# Altium integrated library TI Power Management DC-DC Controller (External Switch).IntLib: 349 symbols (part 15 of 22)
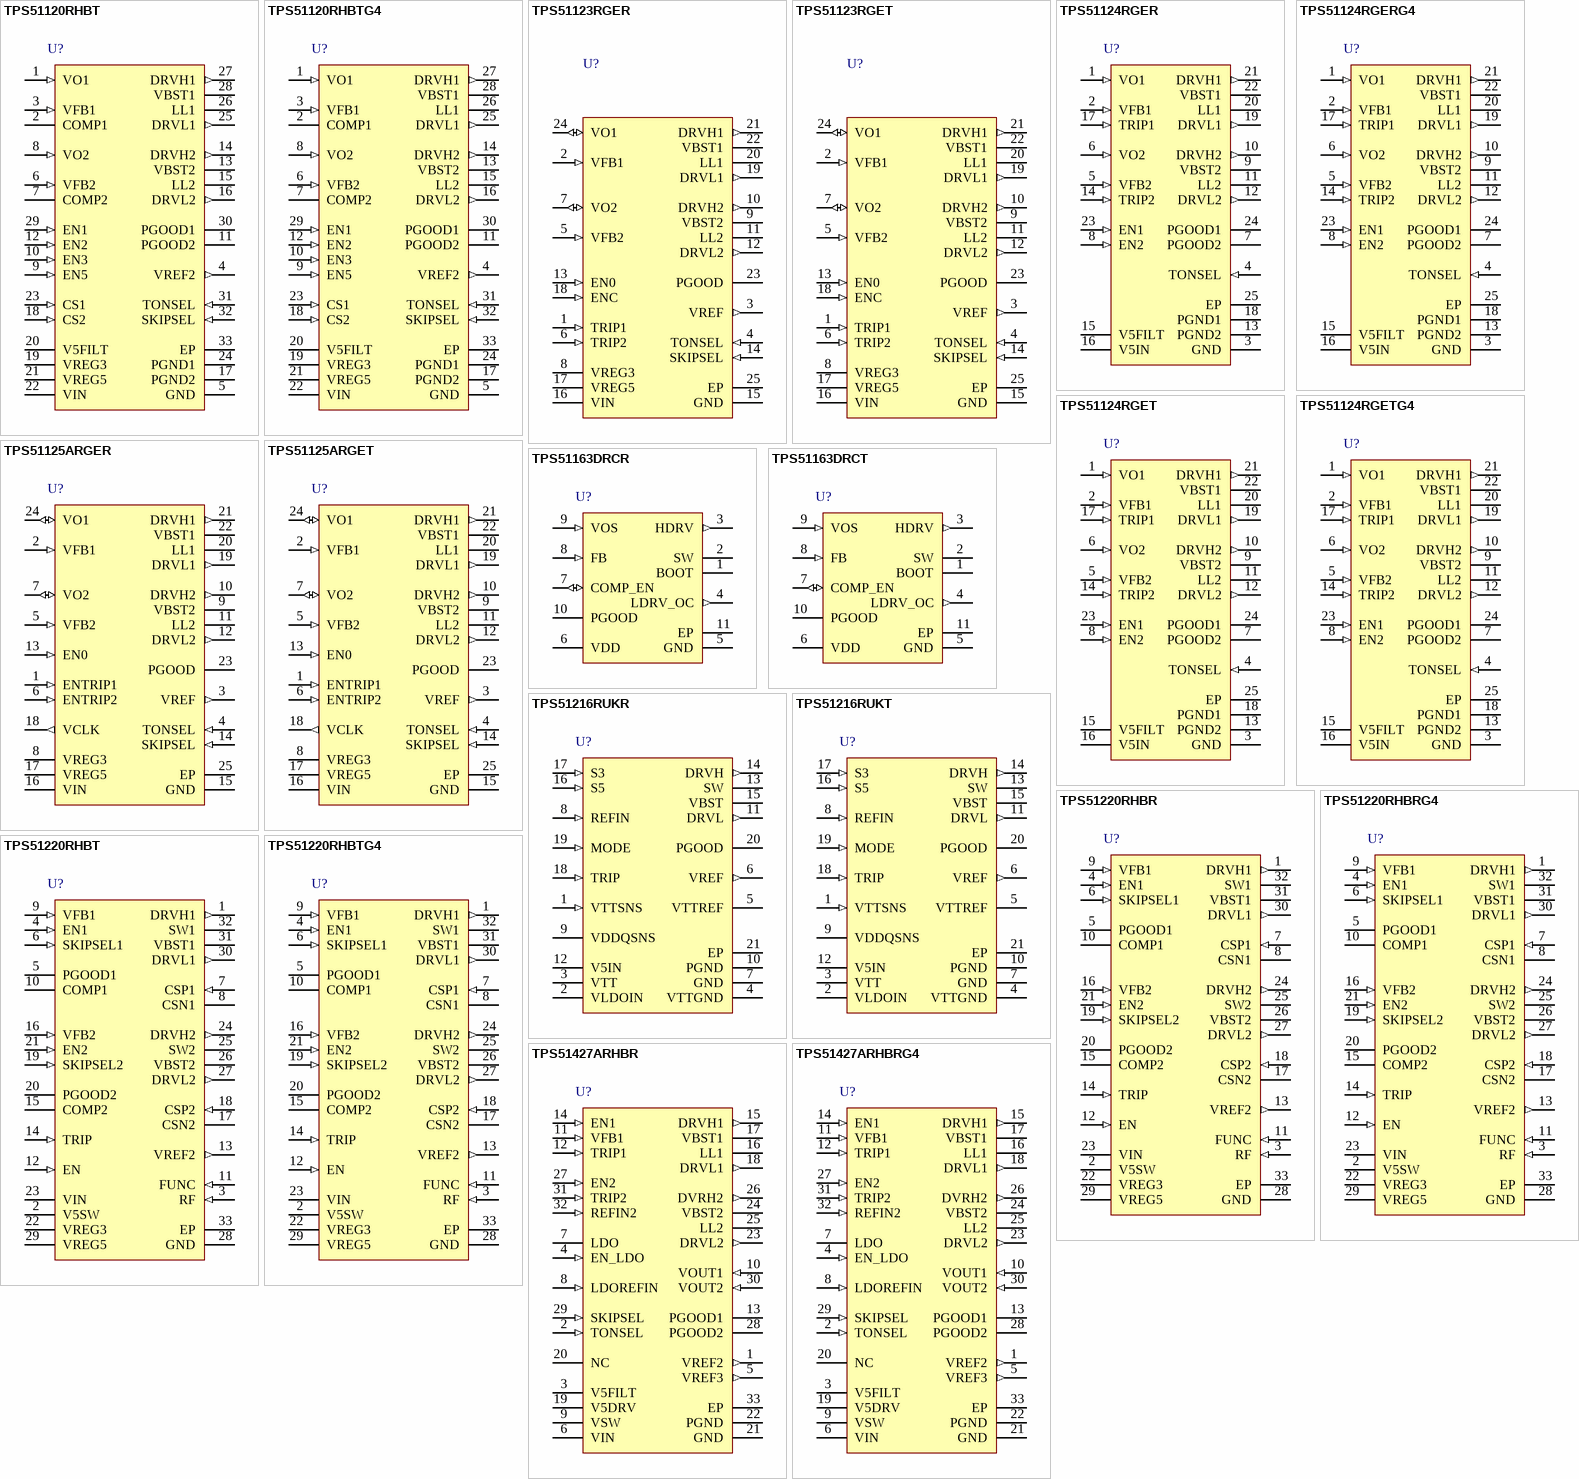
[diagram p28: symbols TPS51120RHBT to TPS51427ARHBRG4]

## TPS51123RGER
designator U?
Dual-Synchronous, Step-Down Controller with Out-of-Audio Operation, 100 mA LDOs for Notebook Sys. Pwr, 93 % Duty Cycle, 5.5 to 28 V, -40 to 85 degC, 24-pin VQFN (RGE), Green (RoHS & no Sb/Br); Manufacturer: Texas Instruments; PartNumber: TPS51123RGER; Duty Cycle(Max)(%): 93; Iout(Max)(A): 20; Regulated Outputs(#): 2; SubFamily: Multiple-Output Switching Controller; Switching Frequency(Max)(kHz): 460; Synchronous Rectification: TRUE; Topology: Buck, D-CAP Mode"; Vin(Max)(V): 28; Vin(Min)(V): 5.5; DatasheetVersion: SLUS890D; PackageVersion: revG, Jul-2011; PackageReference: RGE24-2450X2450TP; PackageDescription: 24-Pin Plastic Quad Flatpack No-Lead, 4 x 4 mm Body, 0.5 mm Pitch; Supplier 1: Digi-Key; Supplier Part Number 1: TPS51123RGER-ND; Eco-Plan: Green (RoHS & no Sb/Br); Iout2(A): 20; Vout(Max)(V): 5.5; Vout(Min)(V): 2; Vout2(Max)(V): 5.5; Vout2(Min)(V): 2; Mounting Technology: Surface Mount; Code_JEDEC: MO-220; ComponentLink1Description: Datasheet; ComponentLink1URL: http://www.ti.com/general/docs/lit/getliterature.tsp?genericPartNumber=TPS51123&fileType=pdf; ComponentLink2Description: Package Specification; ComponentLink2URL: http://www.ti.com/litv/pdf/mpqf124f
footprint RGE24-2450X2450TP (QFN, 24-Leads, Body 4x4mm, Pitch 0.5mm, Thermal Pad 2.45x2.45mm, TI Recommended)
pins: 1 TRIP1 (in) "OCL trip setting pins. Connect resistor from this pin to GND to set threshold for synchronous RDS(on) sense.", 2 VFB1 (in) "SMPS feedback inputs. Connect with feedback resistor divider", 3 VREF (out) "2-V reference voltage output. Connect 220-nF to 1-uF ceramic capacitor to Signal GND near the device.", 4 TONSEL (in) "On-time adjustment pin.365 kHz/460 kHz setting: connect to VREG5   300 kHz/375 kHz setting: connect to VREG3    245 kHz/305 kHz setting: connect to VREF   200 kHz/250 kHz setting: connect to GND", 5 VFB2 (in) "SMPS feedback inputs. Connect with feedback resistor divider", 6 TRIP2 (in) "OCL trip setting pins. Connect resistor from this pin to GND to set threshold for synchronous RDS(on) sense.", 7 VO2 (io) "Output connection to SMPS. These terminals work as fixed voltage inputs and output discharge inputs. VO1 and VO2 also work as 5-V and 3.3-V switch over return power input respectively.", 8 VREG3 (power) "3.3-V power supply output. Connect a 10-uF ceramic capacitor to Power GND near the device. A 1-uF ceramic capacitor is acceptable when not loaded.", 9 VBST2 (power) "Supply input for high-side N-channel MOSFET driver (boost terminal).", 10 DRVH2 (out) "High-side N-channel MOSFET driver outputs. LL referenced drivers.", 11 LL2 (power) "Switch node connections for high-side drivers, current limit and control circuitry.", 12 DRVL2 (out) "Low-side N-channel MOSFET driver outputs. GND referenced drivers.", 13 EN0 (in) "Master enable input. Open : LDOs on, and ready to turn both switcher channels.GND : disable all circuit", 14 SKIPSEL (in) "Selection pin for operation mode:OOA auto skip : Connect to VREG3 or VREG5   PWM only: Connect to VREF  Auto skip: Connect to GND", 15 GND (power) "Ground.", 16 VIN (power) "High voltage power supply input for 5-V/3.3-V LDO.", 17 VREG5 (power) "5-V power supply output. Connect a 33-uF ceramic capacitor to Power GND near the device.", 18 ENC (in) "Channel 1 and Channel 2 enable input. Pull up to the voltage ranging 3.3-V to 5-V to turn on both switcher channels. Short to ground to shutdown them.", 19 DRVL1 (out) "Low-side N-channel MOSFET driver outputs. GND referenced drivers.", 20 LL1 (power) "Switch node connections for high-side drivers, current limit and control circuitry.", 21 DRVH1 (out) "High-side N-channel MOSFET driver outputs. LL referenced drivers.", 22 VBST1 (power) "Supply input for high-side N-channel MOSFET driver (boost terminal).", 23 PGOOD (oc) "Powergood window comparator output for channel 1 and 2. (Logical AND)", 24 VO1 (io) "Output connection to SMPS. These terminals work as fixed voltage inputs and output discharge inputs. VO1 and VO2 also work as 5-V and 3.3-V switch over return power input respectively.", 25 EP (power) "Exposed Thermal Pad"

## TPS51123RGET
designator U?
Dual-Synchronous, Step-Down Controller with Out-of-Audio Operation, 100 mA LDOs for Notebook Sys. Pwr, 93 % Duty Cycle, 5.5 to 28 V, -40 to 85 degC, 24-pin VQFN (RGE), Green (RoHS & no Sb/Br); Manufacturer: Texas Instruments; PartNumber: TPS51123RGET; Duty Cycle(Max)(%): 93; Iout(Max)(A): 20; Regulated Outputs(#): 2; SubFamily: Multiple-Output Switching Controller; Switching Frequency(Max)(kHz): 460; Synchronous Rectification: TRUE; Topology: Buck, D-CAP Mode"; Vin(Max)(V): 28; Vin(Min)(V): 5.5; DatasheetVersion: SLUS890D; PackageVersion: revG, Jul-2011; PackageReference: RGE24-2450X2450TP; PackageDescription: 24-Pin Plastic Quad Flatpack No-Lead, 4 x 4 mm Body, 0.5 mm Pitch; Supplier 1: Digi-Key; Supplier Part Number 1: 296-24069-2-ND; Eco-Plan: Green (RoHS & no Sb/Br); Iout2(A): 20; Vout(Max)(V): 5.5; Vout(Min)(V): 2; Vout2(Max)(V): 5.5; Vout2(Min)(V): 2; Mounting Technology: Surface Mount; Code_JEDEC: MO-220; ComponentLink1Description: Datasheet; ComponentLink1URL: http://www.ti.com/general/docs/lit/getliterature.tsp?genericPartNumber=TPS51123&fileType=pdf; ComponentLink2Description: Package Specification; ComponentLink2URL: http://www.ti.com/litv/pdf/mpqf124f
footprint RGE24-2450X2450TP (QFN, 24-Leads, Body 4x4mm, Pitch 0.5mm, Thermal Pad 2.45x2.45mm, TI Recommended)
pins: 1 TRIP1 (in) "OCL trip setting pins. Connect resistor from this pin to GND to set threshold for synchronous RDS(on) sense.", 2 VFB1 (in) "SMPS feedback inputs. Connect with feedback resistor divider", 3 VREF (out) "2-V reference voltage output. Connect 220-nF to 1-uF ceramic capacitor to Signal GND near the device.", 4 TONSEL (in) "On-time adjustment pin.365 kHz/460 kHz setting: connect to VREG5   300 kHz/375 kHz setting: connect to VREG3    245 kHz/305 kHz setting: connect to VREF   200 kHz/250 kHz setting: connect to GND", 5 VFB2 (in) "SMPS feedback inputs. Connect with feedback resistor divider", 6 TRIP2 (in) "OCL trip setting pins. Connect resistor from this pin to GND to set threshold for synchronous RDS(on) sense.", 7 VO2 (io) "Output connection to SMPS. These terminals work as fixed voltage inputs and output discharge inputs. VO1 and VO2 also work as 5-V and 3.3-V switch over return power input respectively.", 8 VREG3 (power) "3.3-V power supply output. Connect a 10-uF ceramic capacitor to Power GND near the device. A 1-uF ceramic capacitor is acceptable when not loaded.", 9 VBST2 (power) "Supply input for high-side N-channel MOSFET driver (boost terminal).", 10 DRVH2 (out) "High-side N-channel MOSFET driver outputs. LL referenced drivers.", 11 LL2 (power) "Switch node connections for high-side drivers, current limit and control circuitry.", 12 DRVL2 (out) "Low-side N-channel MOSFET driver outputs. GND referenced drivers.", 13 EN0 (in) "Master enable input. Open : LDOs on, and ready to turn both switcher channels.GND : disable all circuit", 14 SKIPSEL (in) "Selection pin for operation mode:OOA auto skip : Connect to VREG3 or VREG5   PWM only: Connect to VREF  Auto skip: Connect to GND", 15 GND (power) "Ground.", 16 VIN (power) "High voltage power supply input for 5-V/3.3-V LDO.", 17 VREG5 (power) "5-V power supply output. Connect a 33-uF ceramic capacitor to Power GND near the device.", 18 ENC (in) "Channel 1 and Channel 2 enable input. Pull up to the voltage ranging 3.3-V to 5-V to turn on both switcher channels. Short to ground to shutdown them.", 19 DRVL1 (out) "Low-side N-channel MOSFET driver outputs. GND referenced drivers.", 20 LL1 (power) "Switch node connections for high-side drivers, current limit and control circuitry.", 21 DRVH1 (out) "High-side N-channel MOSFET driver outputs. LL referenced drivers.", 22 VBST1 (power) "Supply input for high-side N-channel MOSFET driver (boost terminal).", 23 PGOOD (oc) "Powergood window comparator output for channel 1 and 2. (Logical AND)", 24 VO1 (io) "Output connection to SMPS. These terminals work as fixed voltage inputs and output discharge inputs. VO1 and VO2 also work as 5-V and 3.3-V switch over return power input respectively.", 25 EP (power) "Exposed Thermal Pad"

## TPS51124RGER
designator U?
Dual, Synchronous Step Down Controller for Low Voltage System Power, 88 % Duty Cycle, 3 to 28 V, -40 to 85 degC, 24-pin VQFN (RGE), Green (RoHS & no Sb/Br); Manufacturer: Texas Instruments; PartNumber: TPS51124RGER; Duty Cycle(Max)(%): 88; Iout(Max)(A): 15; Iout2(A): 20; Regulated Outputs(#): 2; SubFamily: Multiple-Output Switching Controller; Switching Frequency(Max)(kHz): 420; Synchronous Rectification: TRUE; Topology: Buck, D-CAP Mode"; Vin(Max)(V): 28; Vin(Min)(V): 3; Vout(Max)(V): 5.5; Vout(Min)(V): 0.76; DatasheetVersion: SLVS616B; PackageVersion: revG, Jul-2011; PackageReference: RGE24-2450X2450TP; PackageDescription: 24-Pin Plastic Quad Flatpack No-Lead, 4 x 4 mm Body, 0.5 mm Pitch; Supplier 1: Digi-Key; Supplier Part Number 1: 296-26976-2-ND; Eco-Plan: Green (RoHS & no Sb/Br); Vout2(Max)(V): 5.5; Vout2(Min)(V): 0.76; Mounting Technology: Surface Mount; Code_JEDEC: MO-220; ComponentLink1Description: Datasheet; ComponentLink1URL: http://www.ti.com/general/docs/lit/getliterature.tsp?genericPartNumber=TPS51124&fileType=pdf; ComponentLink2Description: Package Specification; ComponentLink2URL: http://www.ti.com/litv/pdf/mpqf124f
footprint RGE24-2450X2450TP (QFN, 24-Leads, Body 4x4mm, Pitch 0.5mm, Thermal Pad 2.45x2.45mm, TI Recommended)
pins: 1 VO1 (in) "Output connections to SMPS. This terminal serve two functions: On-time adjustment and output discharge.", 2 VFB1 (in) "SMPS voltage feedback input. Connect with feedback resistor divider.", 3 GND (power) "Signal ground pin", 4 TONSEL (in) "On-time selection pin.", 5 VFB2 (in) "SMPS voltage feedback input. Connect with feedback resistor divider.", 6 VO2 (in) "Output connections to SMPS. This terminal serve two functions: On-time adjustment and output  discharge.", 7 PGOOD2 (oc) "Power Good window comparator open drain output for channel 2. Pull up with a resistor to 5 V, or appropriate signal voltage. Current capability is 5 mA. PGOOD goes high 0.5 ms after VFB comes within specified limits. Power (See Datasheet)", 8 EN2 (in) "Channel 2 enable pin. Connect to 5 V or 3.3 V to turn on SMPS", 9 VBST2 (power) "Supply input for synchronous high-side MOSFET driver (Boost Terminal). Connect capacitor from this pin to respective LL terminals. An internal PN diode is connected between V5IN to each of these pins. User can add external (See Datasheet)", 10 DRVH2 (out) "Synchronous high-side MOSFET driver output. LL node referenced floating drivers. The gate drive voltage is defined by the voltage across VBST to LL node flying capacitor.", 11 LL2 (power) "Switch node connections for high-side drivers return. Also serve as input to current comparators and input voltage monitor for on-time control circuitry.", 12 DRVL2 (out) "Synchronous low-side MOSFET driver output. PGND referenced drivers. The gate drive voltage is defined by V5IN voltage.", 13 PGND2 (power) "Ground returns for DRVL1 and DRVL2. Also serve as input of current comparators. Connect PGND1, PGND2, and GND strongly together near the IC. Output discharge current flows through this pin, also.", 14 TRIP2 (in) "Over-current trip point set input. Connect resistor from this pin to GND to set threshold for synchronous low-side RDS(on) sense. Voltage across this pin and GND is compared to voltage across PGND and LL at over-current (See Datasheet)", 15 V5FILT (power) "5-V power supply input for the entire control circuit except the MOSFET drivers. Connect RC low-pass filter from V5IN to V5FILT.", 16 V5IN (power) "5-V power supply input for FET gate drivers. Internally connected to VBSTx by PN diodes.", 17 TRIP1 (in) "Over-current trip point set input. Connect resistor from this pin to GND to set threshold for synchronous low-side RDS(on) sense. Voltage across this pin and GND is compared to voltage across PGND and LL at over-current (See Datasheet)", 18 PGND1 (power) "Ground returns for DRVL1 and DRVL2. Also serve as input of current comparators. Connect PGND1, PGND2, and GND strongly together near the IC. Output discharge current flows through this pin, also.", 19 DRVL1 (out) "Synchronous low-side MOSFET driver output. PGND referenced drivers. The gate drive voltage is defined by V5IN voltage.", 20 LL1 (power) "Switch node connections for high-side drivers return. Also serve as input to current comparators and input voltage monitor for on-time control circuitry.", 21 DRVH1 (out) "Synchronous high-side MOSFET driver output. LL node referenced floating drivers. The gate drive voltage is defined by the voltage across VBST to LL node flying capacitor.", 22 VBST1 (power) "Supply input for synchronous high-side MOSFET driver (Boost Terminal). Connect capacitor from this pin to respective LL terminals. An internal PN diode is connected between V5IN to each of these pins. User can add external (See Datasheet)", 23 EN1 (in) "Channel 1 enable pin. Connect to 5 V or 3.3 V to turn on SMPS", 24 PGOOD1 (oc) "Power Good window comparator open drain output for channel 1. Pull up with a resistor to 5 V, or appropriate signal voltage. Current capability is 5 mA. PGOOD goes high 0.5 ms after VFB comes within specified limits. Power (See Datasheet)", 25 EP "Exposed Thermal Pad."

## TPS51124RGERG4
designator U?
Dual, Synchronous Step Down Controller for Low Voltage System Power, 88 % Duty Cycle, 3 to 28 V, -40 to 85 degC, 24-pin VQFN (RGE), Green (RoHS & no Sb/Br); Manufacturer: Texas Instruments; PartNumber: TPS51124RGERG4; Duty Cycle(Max)(%): 88; Iout(Max)(A): 15; Iout2(A): 20; Regulated Outputs(#): 2; SubFamily: Multiple-Output Switching Controller; Switching Frequency(Max)(kHz): 420; Synchronous Rectification: TRUE; Topology: Buck, D-CAP Mode"; Vin(Max)(V): 28; Vin(Min)(V): 3; Vout(Max)(V): 5.5; Vout(Min)(V): 0.76; DatasheetVersion: SLVS616B; PackageVersion: revG, Jul-2011; PackageReference: RGE24-2450X2450TP; PackageDescription: 24-Pin Plastic Quad Flatpack No-Lead, 4 x 4 mm Body, 0.5 mm Pitch; Supplier 1: Digi-Key; Supplier Part Number 1: TPS51124RGERG4-ND; Eco-Plan: Green (RoHS & no Sb/Br); Vout2(Max)(V): 5.5; Vout2(Min)(V): 0.76; Mounting Technology: Surface Mount; Code_JEDEC: MO-220; ComponentLink1Description: Datasheet; ComponentLink1URL: http://www.ti.com/general/docs/lit/getliterature.tsp?genericPartNumber=TPS51124&fileType=pdf; ComponentLink2Description: Package Specification; ComponentLink2URL: http://www.ti.com/litv/pdf/mpqf124f
footprint RGE24-2450X2450TP (QFN, 24-Leads, Body 4x4mm, Pitch 0.5mm, Thermal Pad 2.45x2.45mm, TI Recommended)
pins: 1 VO1 (in) "Output connections to SMPS. This terminal serve two functions: On-time adjustment and output discharge.", 2 VFB1 (in) "SMPS voltage feedback input. Connect with feedback resistor divider.", 3 GND (power) "Signal ground pin", 4 TONSEL (in) "On-time selection pin.", 5 VFB2 (in) "SMPS voltage feedback input. Connect with feedback resistor divider.", 6 VO2 (in) "Output connections to SMPS. This terminal serve two functions: On-time adjustment and output  discharge.", 7 PGOOD2 (oc) "Power Good window comparator open drain output for channel 2. Pull up with a resistor to 5 V, or appropriate signal voltage. Current capability is 5 mA. PGOOD goes high 0.5 ms after VFB comes within specified limits. Power (See Datasheet)", 8 EN2 (in) "Channel 2 enable pin. Connect to 5 V or 3.3 V to turn on SMPS", 9 VBST2 (power) "Supply input for synchronous high-side MOSFET driver (Boost Terminal). Connect capacitor from this pin to respective LL terminals. An internal PN diode is connected between V5IN to each of these pins. User can add external (See Datasheet)", 10 DRVH2 (out) "Synchronous high-side MOSFET driver output. LL node referenced floating drivers. The gate drive voltage is defined by the voltage across VBST to LL node flying capacitor.", 11 LL2 (power) "Switch node connections for high-side drivers return. Also serve as input to current comparators and input voltage monitor for on-time control circuitry.", 12 DRVL2 (out) "Synchronous low-side MOSFET driver output. PGND referenced drivers. The gate drive voltage is defined by V5IN voltage.", 13 PGND2 (power) "Ground returns for DRVL1 and DRVL2. Also serve as input of current comparators. Connect PGND1, PGND2, and GND strongly together near the IC. Output discharge current flows through this pin, also.", 14 TRIP2 (in) "Over-current trip point set input. Connect resistor from this pin to GND to set threshold for synchronous low-side RDS(on) sense. Voltage across this pin and GND is compared to voltage across PGND and LL at over-current (See Datasheet)", 15 V5FILT (power) "5-V power supply input for the entire control circuit except the MOSFET drivers. Connect RC low-pass filter from V5IN to V5FILT.", 16 V5IN (power) "5-V power supply input for FET gate drivers. Internally connected to VBSTx by PN diodes.", 17 TRIP1 (in) "Over-current trip point set input. Connect resistor from this pin to GND to set threshold for synchronous low-side RDS(on) sense. Voltage across this pin and GND is compared to voltage across PGND and LL at over-current (See Datasheet)", 18 PGND1 (power) "Ground returns for DRVL1 and DRVL2. Also serve as input of current comparators. Connect PGND1, PGND2, and GND strongly together near the IC. Output discharge current flows through this pin, also.", 19 DRVL1 (out) "Synchronous low-side MOSFET driver output. PGND referenced drivers. The gate drive voltage is defined by V5IN voltage.", 20 LL1 (power) "Switch node connections for high-side drivers return. Also serve as input to current comparators and input voltage monitor for on-time control circuitry.", 21 DRVH1 (out) "Synchronous high-side MOSFET driver output. LL node referenced floating drivers. The gate drive voltage is defined by the voltage across VBST to LL node flying capacitor.", 22 VBST1 (power) "Supply input for synchronous high-side MOSFET driver (Boost Terminal). Connect capacitor from this pin to respective LL terminals. An internal PN diode is connected between V5IN to each of these pins. User can add external (See Datasheet)", 23 EN1 (in) "Channel 1 enable pin. Connect to 5 V or 3.3 V to turn on SMPS", 24 PGOOD1 (oc) "Power Good window comparator open drain output for channel 1. Pull up with a resistor to 5 V, or appropriate signal voltage. Current capability is 5 mA. PGOOD goes high 0.5 ms after VFB comes within specified limits. Power (See Datasheet)", 25 EP "Exposed Thermal Pad."

## TPS51124RGET
designator U?
Dual, Synchronous Step Down Controller for Low Voltage System Power, 88 % Duty Cycle, 3 to 28 V, -40 to 85 degC, 24-pin VQFN (RGE), Green (RoHS & no Sb/Br); Manufacturer: Texas Instruments; PartNumber: TPS51124RGET; Duty Cycle(Max)(%): 88; Iout(Max)(A): 15; Iout2(A): 20; Regulated Outputs(#): 2; SubFamily: Multiple-Output Switching Controller; Switching Frequency(Max)(kHz): 420; Synchronous Rectification: TRUE; Topology: Buck, D-CAP Mode"; Vin(Max)(V): 28; Vin(Min)(V): 3; Vout(Max)(V): 5.5; Vout(Min)(V): 0.76; DatasheetVersion: SLVS616B; PackageVersion: revG, Jul-2011; PackageReference: RGE24-2450X2450TP; PackageDescription: 24-Pin Plastic Quad Flatpack No-Lead, 4 x 4 mm Body, 0.5 mm Pitch; Supplier 1: Digi-Key; Supplier Part Number 1: 296-19295-2-ND; Eco-Plan: Green (RoHS & no Sb/Br); Vout2(Max)(V): 5.5; Vout2(Min)(V): 0.76; Mounting Technology: Surface Mount; Code_JEDEC: MO-220; ComponentLink1Description: Datasheet; ComponentLink1URL: http://www.ti.com/general/docs/lit/getliterature.tsp?genericPartNumber=TPS51124&fileType=pdf; ComponentLink2Description: Package Specification; ComponentLink2URL: http://www.ti.com/litv/pdf/mpqf124f
footprint RGE24-2450X2450TP (QFN, 24-Leads, Body 4x4mm, Pitch 0.5mm, Thermal Pad 2.45x2.45mm, TI Recommended)
pins: 1 VO1 (in) "Output connections to SMPS. This terminal serve two functions: On-time adjustment and output discharge.", 2 VFB1 (in) "SMPS voltage feedback input. Connect with feedback resistor divider.", 3 GND (power) "Signal ground pin", 4 TONSEL (in) "On-time selection pin.", 5 VFB2 (in) "SMPS voltage feedback input. Connect with feedback resistor divider.", 6 VO2 (in) "Output connections to SMPS. This terminal serve two functions: On-time adjustment and output  discharge.", 7 PGOOD2 (oc) "Power Good window comparator open drain output for channel 2. Pull up with a resistor to 5 V, or appropriate signal voltage. Current capability is 5 mA. PGOOD goes high 0.5 ms after VFB comes within specified limits. Power (See Datasheet)", 8 EN2 (in) "Channel 2 enable pin. Connect to 5 V or 3.3 V to turn on SMPS", 9 VBST2 (power) "Supply input for synchronous high-side MOSFET driver (Boost Terminal). Connect capacitor from this pin to respective LL terminals. An internal PN diode is connected between V5IN to each of these pins. User can add external (See Datasheet)", 10 DRVH2 (out) "Synchronous high-side MOSFET driver output. LL node referenced floating drivers. The gate drive voltage is defined by the voltage across VBST to LL node flying capacitor.", 11 LL2 (power) "Switch node connections for high-side drivers return. Also serve as input to current comparators and input voltage monitor for on-time control circuitry.", 12 DRVL2 (out) "Synchronous low-side MOSFET driver output. PGND referenced drivers. The gate drive voltage is defined by V5IN voltage.", 13 PGND2 (power) "Ground returns for DRVL1 and DRVL2. Also serve as input of current comparators. Connect PGND1, PGND2, and GND strongly together near the IC. Output discharge current flows through this pin, also.", 14 TRIP2 (in) "Over-current trip point set input. Connect resistor from this pin to GND to set threshold for synchronous low-side RDS(on) sense. Voltage across this pin and GND is compared to voltage across PGND and LL at over-current (See Datasheet)", 15 V5FILT (power) "5-V power supply input for the entire control circuit except the MOSFET drivers. Connect RC low-pass filter from V5IN to V5FILT.", 16 V5IN (power) "5-V power supply input for FET gate drivers. Internally connected to VBSTx by PN diodes.", 17 TRIP1 (in) "Over-current trip point set input. Connect resistor from this pin to GND to set threshold for synchronous low-side RDS(on) sense. Voltage across this pin and GND is compared to voltage across PGND and LL at over-current (See Datasheet)", 18 PGND1 (power) "Ground returns for DRVL1 and DRVL2. Also serve as input of current comparators. Connect PGND1, PGND2, and GND strongly together near the IC. Output discharge current flows through this pin, also.", 19 DRVL1 (out) "Synchronous low-side MOSFET driver output. PGND referenced drivers. The gate drive voltage is defined by V5IN voltage.", 20 LL1 (power) "Switch node connections for high-side drivers return. Also serve as input to current comparators and input voltage monitor for on-time control circuitry.", 21 DRVH1 (out) "Synchronous high-side MOSFET driver output. LL node referenced floating drivers. The gate drive voltage is defined by the voltage across VBST to LL node flying capacitor.", 22 VBST1 (power) "Supply input for synchronous high-side MOSFET driver (Boost Terminal). Connect capacitor from this pin to respective LL terminals. An internal PN diode is connected between V5IN to each of these pins. User can add external (See Datasheet)", 23 EN1 (in) "Channel 1 enable pin. Connect to 5 V or 3.3 V to turn on SMPS", 24 PGOOD1 (oc) "Power Good window comparator open drain output for channel 1. Pull up with a resistor to 5 V, or appropriate signal voltage. Current capability is 5 mA. PGOOD goes high 0.5 ms after VFB comes within specified limits. Power (See Datasheet)", 25 EP "Exposed Thermal Pad."

## TPS51124RGETG4
designator U?
Dual, Synchronous Step Down Controller for Low Voltage System Power, 88 % Duty Cycle, 3 to 28 V, -40 to 85 degC, 24-pin VQFN (RGE), Green (RoHS & no Sb/Br); Manufacturer: Texas Instruments; PartNumber: TPS51124RGETG4; Duty Cycle(Max)(%): 88; Iout(Max)(A): 15; Iout2(A): 20; Regulated Outputs(#): 2; SubFamily: Multiple-Output Switching Controller; Switching Frequency(Max)(kHz): 420; Synchronous Rectification: TRUE; Topology: Buck, D-CAP Mode"; Vin(Max)(V): 28; Vin(Min)(V): 3; Vout(Max)(V): 5.5; Vout(Min)(V): 0.76; DatasheetVersion: SLVS616B; PackageVersion: revG, Jul-2011; PackageReference: RGE24-2450X2450TP; PackageDescription: 24-Pin Plastic Quad Flatpack No-Lead, 4 x 4 mm Body, 0.5 mm Pitch; Supplier 1: Digi-Key; Supplier Part Number 1: TPS51124RGETG4-ND; Eco-Plan: Green (RoHS & no Sb/Br); Vout2(Max)(V): 5.5; Vout2(Min)(V): 0.76; Mounting Technology: Surface Mount; Code_JEDEC: MO-220; ComponentLink1Description: Datasheet; ComponentLink1URL: http://www.ti.com/general/docs/lit/getliterature.tsp?genericPartNumber=TPS51124&fileType=pdf; ComponentLink2Description: Package Specification; ComponentLink2URL: http://www.ti.com/litv/pdf/mpqf124f
footprint RGE24-2450X2450TP (QFN, 24-Leads, Body 4x4mm, Pitch 0.5mm, Thermal Pad 2.45x2.45mm, TI Recommended)
pins: 1 VO1 (in) "Output connections to SMPS. This terminal serve two functions: On-time adjustment and output discharge.", 2 VFB1 (in) "SMPS voltage feedback input. Connect with feedback resistor divider.", 3 GND (power) "Signal ground pin", 4 TONSEL (in) "On-time selection pin.", 5 VFB2 (in) "SMPS voltage feedback input. Connect with feedback resistor divider.", 6 VO2 (in) "Output connections to SMPS. This terminal serve two functions: On-time adjustment and output  discharge.", 7 PGOOD2 (oc) "Power Good window comparator open drain output for channel 2. Pull up with a resistor to 5 V, or appropriate signal voltage. Current capability is 5 mA. PGOOD goes high 0.5 ms after VFB comes within specified limits. Power (See Datasheet)", 8 EN2 (in) "Channel 2 enable pin. Connect to 5 V or 3.3 V to turn on SMPS", 9 VBST2 (power) "Supply input for synchronous high-side MOSFET driver (Boost Terminal). Connect capacitor from this pin to respective LL terminals. An internal PN diode is connected between V5IN to each of these pins. User can add external (See Datasheet)", 10 DRVH2 (out) "Synchronous high-side MOSFET driver output. LL node referenced floating drivers. The gate drive voltage is defined by the voltage across VBST to LL node flying capacitor.", 11 LL2 (power) "Switch node connections for high-side drivers return. Also serve as input to current comparators and input voltage monitor for on-time control circuitry.", 12 DRVL2 (out) "Synchronous low-side MOSFET driver output. PGND referenced drivers. The gate drive voltage is defined by V5IN voltage.", 13 PGND2 (power) "Ground returns for DRVL1 and DRVL2. Also serve as input of current comparators. Connect PGND1, PGND2, and GND strongly together near the IC. Output discharge current flows through this pin, also.", 14 TRIP2 (in) "Over-current trip point set input. Connect resistor from this pin to GND to set threshold for synchronous low-side RDS(on) sense. Voltage across this pin and GND is compared to voltage across PGND and LL at over-current (See Datasheet)", 15 V5FILT (power) "5-V power supply input for the entire control circuit except the MOSFET drivers. Connect RC low-pass filter from V5IN to V5FILT.", 16 V5IN (power) "5-V power supply input for FET gate drivers. Internally connected to VBSTx by PN diodes.", 17 TRIP1 (in) "Over-current trip point set input. Connect resistor from this pin to GND to set threshold for synchronous low-side RDS(on) sense. Voltage across this pin and GND is compared to voltage across PGND and LL at over-current (See Datasheet)", 18 PGND1 (power) "Ground returns for DRVL1 and DRVL2. Also serve as input of current comparators. Connect PGND1, PGND2, and GND strongly together near the IC. Output discharge current flows through this pin, also.", 19 DRVL1 (out) "Synchronous low-side MOSFET driver output. PGND referenced drivers. The gate drive voltage is defined by V5IN voltage.", 20 LL1 (power) "Switch node connections for high-side drivers return. Also serve as input to current comparators and input voltage monitor for on-time control circuitry.", 21 DRVH1 (out) "Synchronous high-side MOSFET driver output. LL node referenced floating drivers. The gate drive voltage is defined by the voltage across VBST to LL node flying capacitor.", 22 VBST1 (power) "Supply input for synchronous high-side MOSFET driver (Boost Terminal). Connect capacitor from this pin to respective LL terminals. An internal PN diode is connected between V5IN to each of these pins. User can add external (See Datasheet)", 23 EN1 (in) "Channel 1 enable pin. Connect to 5 V or 3.3 V to turn on SMPS", 24 PGOOD1 (oc) "Power Good window comparator open drain output for channel 1. Pull up with a resistor to 5 V, or appropriate signal voltage. Current capability is 5 mA. PGOOD goes high 0.5 ms after VFB comes within specified limits. Power (See Datasheet)", 25 EP "Exposed Thermal Pad."

## TPS51125ARGER
designator U?
Dual-Synchronous, Step-Down Controller with Out-of-Audio Operation and 100-mA LDOs, 93 % Duty Cycle, 5.5 to 28 V, -40 to 85 degC, 24-pin VQFN (RGE), Green (RoHS & no Sb/Br); Manufacturer: Texas Instruments; PartNumber: TPS51125ARGER; Duty Cycle(Max)(%): 93; Iout(Max)(A): 20; Regulated Outputs(#): 2; SubFamily: Multiple-Output Switching Controller; Switching Frequency(Max)(kHz): 460; Synchronous Rectification: TRUE; Topology: Buck, D-CAP Mode"; Vin(Max)(V): 28; Vin(Min)(V): 5.5; DatasheetVersion: SLUS976F; PackageVersion: revG, Jul-2011; PackageReference: RGE24-2450X2450TP; PackageDescription: 24-Pin Plastic Quad Flatpack No-Lead, 4 x 4 mm Body, 0.5 mm Pitch; Supplier 1: Digi-Key; Supplier Part Number 1: 296-25557-2-ND; Eco-Plan: Green (RoHS & no Sb/Br); Iout2(A): 20; Vout(Max)(V): 5.5; Vout(Min)(V): 2; Vout2(Max)(V): 5.5; Vout2(Min)(V): 2; Mounting Technology: Surface Mount; Code_JEDEC: MO-220; ComponentLink1Description: Datasheet; ComponentLink1URL: http://www.ti.com/general/docs/lit/getliterature.tsp?genericPartNumber=TPS51125A&fileType=pdf; ComponentLink2Description: Package Specification; ComponentLink2URL: http://www.ti.com/litv/pdf/mpqf124f
footprint RGE24-2450X2450TP (QFN, 24-Leads, Body 4x4mm, Pitch 0.5mm, Thermal Pad 2.45x2.45mm, TI Recommended)
pins: 1 ENTRIP1 (in) "Channel 1 and Channel 2 enable and OCL trip setting pins.Connect resistor from this pin to GND to set threshold for synchronous RDS(on) sense. Short to ground to shutdown a switcher channel.", 2 VFB1 (in) "SMPS feedback inputs. Connect with feedback resistor divider.", 3 VREF (out) "2-V reference voltage output. Connect 220-nF to 1-uF, high-quality X5R or X7R ceramic capacitor to Signal GND near the device.", 4 TONSEL (in) "On-time adjustment pin.365 kHz/460 kHz setting : connect to VREG5 300 kHz/375 kHz setting : connect to VREG3 245 kHz/305 kHz setting : connect to VREF 200 kHz/250 kHz setting : connect to GND", 5 VFB2 (in) "SMPS feedback inputs. Connect with feedback resistor divider.", 6 ENTRIP2 (in) "Channel 1 and Channel 2 enable and OCL trip setting pins.Connect resistor from this pin to GND to set threshold for synchronous RDS(on) sense. Short to ground to shutdown a switcher channel.", 7 VO2 (io) "Output connection to SMPS. These terminals work as fixed voltage inputs and output discharge inputs. VO1 and VO2 also work as 5 V and 3.3 V switch over return power input respectively.", 8 VREG3 (power) "3.3-V power supply output. Connect 10-uF or larger, high-quality X5R or X7R ceramic capacitor", 9 VBST2 (power) "Supply input for high-side N-channel MOSFET driver (boost terminal).", 10 DRVH2 (out) "High-side N-channel MOSFET driver outputs. LL referenced drivers.", 11 LL2 (power) "Switch node connections for high-side drivers, current limit and control circuitry.", 12 DRVL2 (out) "Low-side N-channel MOSFET driver outputs. GND referenced drivers.", 13 EN0 (in) "Master enable input. Open : LDOs on, and ready to turn on VCLK and switcher channels. 620 k ohm to GND : enable both LDOs, VCLK off and ready to turn on switcher channels. Power consumption is almost the same as the case of (See Datasheet)", 14 SKIPSEL (in) "Selection pin for operation mode:  ; OOA auto skip : Connect to VREG3 or VREG5 ; Auto skip : Connect to VREF ;  PWM only : Connect to GND ;", 15 GND (power) "Ground.", 16 VIN (power) "High voltage power supply input for 5-V/3.3-V LDO.", 17 VREG5 (power) "5-V power supply output. Connect 10-uF or larger, high-quality X5R or X7R ceramic capacitor to Power GND near the device.", 18 VCLK (out) "270-kHz clock output for 15-V charge pump.", 19 DRVL1 (out) "Low-side N-channel MOSFET driver outputs. GND referenced drivers.", 20 LL1 (power) "Switch node connections for high-side drivers, current limit and control circuitry.", 21 DRVH1 (out) "High-side N-channel MOSFET driver outputs. LL referenced drivers.", 22 VBST1 (power) "Supply input for high-side N-channel MOSFET driver (boost terminal).", 23 PGOOD (oc) "Power Good window comparator output for channel 1 and 2. (Logical AND)", 24 VO1 (io) "Output connection to SMPS. These terminals work as fixed voltage inputs and output discharge inputs. VO1 and VO2 also work as 5 V and 3.3 V switch over return power input respectively.", 25 EP (power) "THERMAL PAD"

## TPS51125ARGET
designator U?
Dual-Synchronous, Step-Down Controller with Out-of-Audio Operation and 100-mA LDOs, 93 % Duty Cycle, 5.5 to 28 V, -40 to 85 degC, 24-pin VQFN (RGE), Green (RoHS & no Sb/Br); Manufacturer: Texas Instruments; PartNumber: TPS51125ARGET; Duty Cycle(Max)(%): 93; Iout(Max)(A): 20; Regulated Outputs(#): 2; SubFamily: Multiple-Output Switching Controller; Switching Frequency(Max)(kHz): 460; Synchronous Rectification: TRUE; Topology: Buck, D-CAP Mode"; Vin(Max)(V): 28; Vin(Min)(V): 5.5; DatasheetVersion: SLUS976F; PackageVersion: revG, Jul-2011; PackageReference: RGE24-2450X2450TP; PackageDescription: 24-Pin Plastic Quad Flatpack No-Lead, 4 x 4 mm Body, 0.5 mm Pitch; Supplier 1: Digi-Key; Supplier Part Number 1: TPS51125ARGET-ND; Eco-Plan: Green (RoHS & no Sb/Br); Iout2(A): 20; Vout(Max)(V): 5.5; Vout(Min)(V): 2; Vout2(Max)(V): 5.5; Vout2(Min)(V): 2; Mounting Technology: Surface Mount; Code_JEDEC: MO-220; ComponentLink1Description: Datasheet; ComponentLink1URL: http://www.ti.com/general/docs/lit/getliterature.tsp?genericPartNumber=TPS51125A&fileType=pdf; ComponentLink2Description: Package Specification; ComponentLink2URL: http://www.ti.com/litv/pdf/mpqf124f
footprint RGE24-2450X2450TP (QFN, 24-Leads, Body 4x4mm, Pitch 0.5mm, Thermal Pad 2.45x2.45mm, TI Recommended)
pins: 1 ENTRIP1 (in) "Channel 1 and Channel 2 enable and OCL trip setting pins.Connect resistor from this pin to GND to set threshold for synchronous RDS(on) sense. Short to ground to shutdown a switcher channel.", 2 VFB1 (in) "SMPS feedback inputs. Connect with feedback resistor divider.", 3 VREF (out) "2-V reference voltage output. Connect 220-nF to 1-uF, high-quality X5R or X7R ceramic capacitor to Signal GND near the device.", 4 TONSEL (in) "On-time adjustment pin.365 kHz/460 kHz setting : connect to VREG5 300 kHz/375 kHz setting : connect to VREG3 245 kHz/305 kHz setting : connect to VREF 200 kHz/250 kHz setting : connect to GND", 5 VFB2 (in) "SMPS feedback inputs. Connect with feedback resistor divider.", 6 ENTRIP2 (in) "Channel 1 and Channel 2 enable and OCL trip setting pins.Connect resistor from this pin to GND to set threshold for synchronous RDS(on) sense. Short to ground to shutdown a switcher channel.", 7 VO2 (io) "Output connection to SMPS. These terminals work as fixed voltage inputs and output discharge inputs. VO1 and VO2 also work as 5 V and 3.3 V switch over return power input respectively.", 8 VREG3 (power) "3.3-V power supply output. Connect 10-uF or larger, high-quality X5R or X7R ceramic capacitor", 9 VBST2 (power) "Supply input for high-side N-channel MOSFET driver (boost terminal).", 10 DRVH2 (out) "High-side N-channel MOSFET driver outputs. LL referenced drivers.", 11 LL2 (power) "Switch node connections for high-side drivers, current limit and control circuitry.", 12 DRVL2 (out) "Low-side N-channel MOSFET driver outputs. GND referenced drivers.", 13 EN0 (in) "Master enable input. Open : LDOs on, and ready to turn on VCLK and switcher channels. 620 k ohm to GND : enable both LDOs, VCLK off and ready to turn on switcher channels. Power consumption is almost the same as the case of (See Datasheet)", 14 SKIPSEL (in) "Selection pin for operation mode:  ; OOA auto skip : Connect to VREG3 or VREG5 ; Auto skip : Connect to VREF ;  PWM only : Connect to GND ;", 15 GND (power) "Ground.", 16 VIN (power) "High voltage power supply input for 5-V/3.3-V LDO.", 17 VREG5 (power) "5-V power supply output. Connect 10-uF or larger, high-quality X5R or X7R ceramic capacitor to Power GND near the device.", 18 VCLK (out) "270-kHz clock output for 15-V charge pump.", 19 DRVL1 (out) "Low-side N-channel MOSFET driver outputs. GND referenced drivers.", 20 LL1 (power) "Switch node connections for high-side drivers, current limit and control circuitry.", 21 DRVH1 (out) "High-side N-channel MOSFET driver outputs. LL referenced drivers.", 22 VBST1 (power) "Supply input for high-side N-channel MOSFET driver (boost terminal).", 23 PGOOD (oc) "Power Good window comparator output for channel 1 and 2. (Logical AND)", 24 VO1 (io) "Output connection to SMPS. These terminals work as fixed voltage inputs and output discharge inputs. VO1 and VO2 also work as 5 V and 3.3 V switch over return power input respectively.", 25 EP (power) "THERMAL PAD"

## TPS51163DRCR
designator U?
4.5 to 13.2 V Synchronous Buck Controller with High Current Gate Driver, 600 kHz, 69 % Duty Cycle, 4.5 to 13.2 V, -40 to 85 degC, 10-pin SON (DRC), Green (RoHS & no Sb/Br); Manufacturer: Texas Instruments; PartNumber: TPS51163DRCR; Duty Cycle(Max)(%): 69; Regulated Outputs(#): 1; SubFamily: Step-Down Controller; Switching Frequency(Max)(kHz): 600; Synchronous Rectification: TRUE; Vin(Max)(V): 13.2; Vin(Min)(V): 4.5; DatasheetVersion: SLUS864; PackageVersion: revL, Sep-2011; PackageReference: DRC10-2400X1650TP; PackageDescription: 10-Pin Plastic Small Outline No-Lead, 3 x 3 x 1 mm Body, 0.5 mm Pitch, Exposed Pad; Supplier 1: Digi-Key; Supplier Part Number 1: TPS51163DRCR-ND; Eco-Plan: Green (RoHS & no Sb/Br); Topology: Buck; Mounting Technology: Surface Mount; ComponentLink1Description: Datasheet; ComponentLink1URL: http://www.ti.com/general/docs/lit/getliterature.tsp?genericPartNumber=TPS51163&fileType=pdf; ComponentLink2Description: Package Specification; ComponentLink2URL: http://www.ti.com/litv/pdf/mpds117k
footprint DRC10-2400X1650TP (SON, 10-Leads, Body 3x3mm, Pitch 0.5mm, Thermal Pad 2.4x1.65mm, TI Recommended)
pins: 1 BOOT (power) "Gate drive voltage for the high-side N-channel MOSFET. Typically, a 100 nF capacitor must be connected between this pin and SW. Also, a diode from VDD to BOOT should be externally provided.", 2 SW (power) "Sense line for the adaptive anti-cross conduction circuitry. Serves as common connection for the flying high-side FET driver.", 3 HDRV (out) "Gate drive output for the high-side N-channel MOSFET.", 4 LDRV_OC (out) "Gate drive output for the low-side or rectifier MOSFET. The set point is read during start up calibration with the 10 uA current source present.", 5 GND (power) "Common reference for the device", 6 VDD (power) "Power input to the controller, 4.5 V to 13.2 V.", 7 COMP_EN (io) "Output of the error amplifier and the shutdown pin. Pulling the voltage on this pin lower than 800 mV shuts the controller down.", 8 FB (in) "Inverting input to the error amplifier. In normal operation, the voltage on this pin is equal to the internal reference voltage of 800mV.", 9 VOS (in) "Input to set undervoltage and overvoltage protections. Undervoltage protection occurs when VOS voltage is lower than 600mV. The controller shuts down with both MOSFETs latched off. Overvoltage protection occurs when VOS (See Datasheet)", 10 PGOOD (oc) "Open drain power good output. An external pull-up resistor is required.", 11 EP (power)

## TPS51163DRCT
designator U?
4.5 to 13.2 V Synchronous Buck Controller with High Current Gate Driver, 600 kHz, 69 % Duty Cycle, 4.5 to 13.2 V, -40 to 85 degC, 10-pin SON (DRC), Green (RoHS & no Sb/Br); Manufacturer: Texas Instruments; PartNumber: TPS51163DRCT; Duty Cycle(Max)(%): 69; Regulated Outputs(#): 1; SubFamily: Step-Down Controller; Switching Frequency(Max)(kHz): 600; Synchronous Rectification: TRUE; Vin(Max)(V): 13.2; Vin(Min)(V): 4.5; DatasheetVersion: SLUS864; PackageVersion: revL, Sep-2011; PackageReference: DRC10-2400X1650TP; PackageDescription: 10-Pin Plastic Small Outline No-Lead, 3 x 3 x 1 mm Body, 0.5 mm Pitch, Exposed Pad; Supplier 1: Digi-Key; Supplier Part Number 1: 296-24537-2-ND; Eco-Plan: Green (RoHS & no Sb/Br); Topology: Buck; Mounting Technology: Surface Mount; ComponentLink1Description: Datasheet; ComponentLink1URL: http://www.ti.com/general/docs/lit/getliterature.tsp?genericPartNumber=TPS51163&fileType=pdf; ComponentLink2Description: Package Specification; ComponentLink2URL: http://www.ti.com/litv/pdf/mpds117k
footprint DRC10-2400X1650TP (SON, 10-Leads, Body 3x3mm, Pitch 0.5mm, Thermal Pad 2.4x1.65mm, TI Recommended)
pins: 1 BOOT (power) "Gate drive voltage for the high-side N-channel MOSFET. Typically, a 100 nF capacitor must be connected between this pin and SW. Also, a diode from VDD to BOOT should be externally provided.", 2 SW (power) "Sense line for the adaptive anti-cross conduction circuitry. Serves as common connection for the flying high-side FET driver.", 3 HDRV (out) "Gate drive output for the high-side N-channel MOSFET.", 4 LDRV_OC (out) "Gate drive output for the low-side or rectifier MOSFET. The set point is read during start up calibration with the 10 uA current source present.", 5 GND (power) "Common reference for the device", 6 VDD (power) "Power input to the controller, 4.5 V to 13.2 V.", 7 COMP_EN (io) "Output of the error amplifier and the shutdown pin. Pulling the voltage on this pin lower than 800 mV shuts the controller down.", 8 FB (in) "Inverting input to the error amplifier. In normal operation, the voltage on this pin is equal to the internal reference voltage of 800mV.", 9 VOS (in) "Input to set undervoltage and overvoltage protections. Undervoltage protection occurs when VOS voltage is lower than 600mV. The controller shuts down with both MOSFETs latched off. Overvoltage protection occurs when VOS (See Datasheet)", 10 PGOOD (oc) "Open drain power good output. An external pull-up resistor is required.", 11 EP (power)

## TPS51216RUKR
designator U?
DDR2, DDR3 and DDR3L Memory Power Solution Synchronous Buck Controller, 2 A LDO, Buffered Reference, 84 % Duty Cycle, 3 to 28 V, -40 to 85 degC, 20-pin WQFN (RUK), Green (RoHS & no Sb/Br); Manufacturer: Texas Instruments; PartNumber: TPS51216RUKR; Duty Cycle(Max)(%): 84; Iout(Max)(A): 20; Regulated Outputs(#): 1; SubFamily: Multiple-Output Switching Controller; Switching Frequency(Max)(kHz): 400; Topology: Buck , D-CAP Mode; Vin(Max)(V): 28; Vin(Min)(V): 3; Vout(Max)(V): 1.8; Vout(Min)(V): 0.7; DatasheetVersion: SLUSAB9; PackageVersion: revC, Jan-2012; PackageReference: RUK20-1700X1700TP; PackageDescription: 20-Pin Plastic Quad Flatpack No-Lead, 3 x 3 mm Body, 0.4 mm Pitch, 1.8 x 1.8 mm Exposed Pad; Supplier 1: Digi-Key; Supplier Part Number 1: TPS51216RUKR-ND; Eco-Plan: Green (RoHS & no Sb/Br); Mounting Technology: Surface Mount; Code_JEDEC: MO-220; ComponentLink1Description: Datasheet; ComponentLink1URL: http://www.ti.com/general/docs/lit/getliterature.tsp?genericPartNumber=TPS51216&fileType=pdf; ComponentLink2Description: Package Specification; ComponentLink2URL: http://www.ti.com/litv/pdf/mpqf220b
footprint RUK20-1700X1700TP (QFN, 20-Leads, Body 3x3mm, Pitch 0.4mm, Thermal Pad 1.8x1.8mm, TI Recommended)
pins: 1 VTTSNS (in) "VTT output voltage feedback.", 2 VLDOIN (power) "Power supply input for VTT LDO. Connect VDDQ in typical application.", 3 VTT (power) "VTT 2-A LDO output. Need to connect 10uF or larger capacitance for stability.", 4 VTTGND (power) "Power ground for VTT LDO.", 5 VTTREF (hiz) "Buffered VTT reference output. Need to connect 0.22uF or larger capacitance for stability.", 6 VREF (out) "1.8-V reference output.", 7 GND (power) "Signal ground.", 8 REFIN (in) "Reference input for VDDQ. Connect to the midpoint of a resistor divider from VREF to GND. Add a capacitor for stable operation.", 9 VDDQSNS "VDDQ output voltage feedback. Reference input for VTTREF. Also serves as power supply for VTTREF.", 10 PGND (power) "Gate driver power ground. RDS(on) current sensing input(+).", 11 DRVL (out) "Low-side MOSFET gate driver output.", 12 V5IN (power) "5-V power supply input for internal circuits and MOSFET gate drivers.", 13 SW (power) "High-side MOSFET gate driver return. RDS(on) current sensing input(-).", 14 DRVH (out) "High-side MOSFET gate driver output.", 15 VBST (power) "High-side MOSFET gate driver bootstrap voltage input. Connect a capacitor from the VBST pin to the SW pin.", 16 S5 (in) "S5 signal input.", 17 S3 (in) "S3 signal input.", 18 TRIP (in) "Connect resistor to GND to set OCL at VTRIP/8. Output 10-uA current at room temperature, TC = 4700 ppm/degreesC.", 19 MODE (in) "Connect resistor to GND to configure switching frequency and discharge mode.", 20 PGOOD (oc) "Powergood signal open drain output. PGOOD goes high when VDDQ output voltage is within the target range.", 21 EP (power) "Connect to GND"

## TPS51216RUKT
designator U?
DDR2, DDR3 and DDR3L Memory Power Solution Synchronous Buck Controller, 2 A LDO, Buffered Reference, 84 % Duty Cycle, 3 to 28 V, -40 to 85 degC, 20-pin WQFN (RUK), Green (RoHS & no Sb/Br); Manufacturer: Texas Instruments; PartNumber: TPS51216RUKT; Duty Cycle(Max)(%): 84; Iout(Max)(A): 20; Regulated Outputs(#): 1; SubFamily: Multiple-Output Switching Controller; Switching Frequency(Max)(kHz): 400; Topology: Buck , D-CAP Mode; Vin(Max)(V): 28; Vin(Min)(V): 3; Vout(Max)(V): 1.8; Vout(Min)(V): 0.7; DatasheetVersion: SLUSAB9; PackageVersion: revC, Jan-2012; PackageReference: RUK20-1700X1700TP; PackageDescription: 20-Pin Plastic Quad Flatpack No-Lead, 3 x 3 mm Body, 0.4 mm Pitch, 1.8 x 1.8 mm Exposed Pad; Supplier 1: Digi-Key; Supplier Part Number 1: 296-28075-2-ND; Eco-Plan: Green (RoHS & no Sb/Br); Mounting Technology: Surface Mount; Code_JEDEC: MO-220; ComponentLink1Description: Datasheet; ComponentLink1URL: http://www.ti.com/general/docs/lit/getliterature.tsp?genericPartNumber=TPS51216&fileType=pdf; ComponentLink2Description: Package Specification; ComponentLink2URL: http://www.ti.com/litv/pdf/mpqf220b
footprint RUK20-1700X1700TP (QFN, 20-Leads, Body 3x3mm, Pitch 0.4mm, Thermal Pad 1.8x1.8mm, TI Recommended)
pins: 1 VTTSNS (in) "VTT output voltage feedback.", 2 VLDOIN (power) "Power supply input for VTT LDO. Connect VDDQ in typical application.", 3 VTT (power) "VTT 2-A LDO output. Need to connect 10uF or larger capacitance for stability.", 4 VTTGND (power) "Power ground for VTT LDO.", 5 VTTREF (hiz) "Buffered VTT reference output. Need to connect 0.22uF or larger capacitance for stability.", 6 VREF (out) "1.8-V reference output.", 7 GND (power) "Signal ground.", 8 REFIN (in) "Reference input for VDDQ. Connect to the midpoint of a resistor divider from VREF to GND. Add a capacitor for stable operation.", 9 VDDQSNS "VDDQ output voltage feedback. Reference input for VTTREF. Also serves as power supply for VTTREF.", 10 PGND (power) "Gate driver power ground. RDS(on) current sensing input(+).", 11 DRVL (out) "Low-side MOSFET gate driver output.", 12 V5IN (power) "5-V power supply input for internal circuits and MOSFET gate drivers.", 13 SW (power) "High-side MOSFET gate driver return. RDS(on) current sensing input(-).", 14 DRVH (out) "High-side MOSFET gate driver output.", 15 VBST (power) "High-side MOSFET gate driver bootstrap voltage input. Connect a capacitor from the VBST pin to the SW pin.", 16 S5 (in) "S5 signal input.", 17 S3 (in) "S3 signal input.", 18 TRIP (in) "Connect resistor to GND to set OCL at VTRIP/8. Output 10-uA current at room temperature, TC = 4700 ppm/degreesC.", 19 MODE (in) "Connect resistor to GND to configure switching frequency and discharge mode.", 20 PGOOD (oc) "Powergood signal open drain output. PGOOD goes high when VDDQ output voltage is within the target range.", 21 EP (power) "Connect to GND"

## TPS51220RHBR
designator U?
Fixed Frequency, 99 % Duty Cycle Peak Current Mode Notebook System Power Controller, 4.5 to 28 V, -40 to 85 degC, 32-pin QFN (RHB), Green (RoHS & no Sb/Br); Manufacturer: Texas Instruments; PartNumber: TPS51220RHBR; Duty Cycle(Max)(%): 99; Iout(Max)(A): 20; Regulated Outputs(#): 2; SubFamily: Multiple-Output Switching Controller; Switching Frequency(Max)(kHz): 1000; Synchronous Rectification: TRUE; Topology: Buck, D-CAP Mode"; Vin(Max)(V): 28; Vin(Min)(V): 4.5; Vout(Max)(V): 12; Vout(Min)(V): 1; DatasheetVersion: SLVS785C; PackageVersion: revD, Jun-2011; PackageReference: RHB32-3450X3450TP; PackageDescription: 32-Pin Plastic Quad Flat No-Lead, 5 x 5 mm Body, 0.5 mm Pitch, 3.45 x 3.45 mm Exposed Pad; Supplier 1: Digi-Key; Supplier Part Number 1: 296-22940-2-ND; Eco-Plan: Green (RoHS & no Sb/Br); Iout2(A): 20; Vout2(Max)(V): 12; Vout2(Min)(V): 1; Mounting Technology: Surface Mount; Code_JEDEC: MO-220; ComponentLink1Description: Datasheet; ComponentLink1URL: http://www.ti.com/general/docs/lit/getliterature.tsp?genericPartNumber=TPS51220&fileType=pdf; ComponentLink2Description: Package Specification; ComponentLink2URL: http://www.ti.com/litv/pdf/mpqf130c
footprint RHB32-3450X3450TP (QFN, 32-Leads, Body 5x5mm, Pitch 0.5mm, Thermal Pad 3.45x3.45mm, TI Recommended)
pins: 1 DRVH1 (out) "High-side MOSFET gate driver outputs. Source 1.7ohm, sink 1.0ohm, SW-node referenced floating driver. Drive voltage corresponds to VBST to SW voltage", 2 V5SW (power) "VREG5 switchover power supply input pin. When EN1 is high, PGOOD1 indicates GOOD and V5SW voltage is higher than 4.8 V, switch-over function will be enabled. (Note) When switch-over is enabled,  VREG5 output voltage will be (See Datasheet)", 3 RF (in) "Frequency setting pin. Connect a frequency setting resistor to (signal) GND. Connect to an external clock for synchronization.", 4 EN1 (in) "Channel 1 and channel 2 SMPS enable Pins. When turning on, apply greater than 0.55 V and less than 6 V or be floating. Connect to GND to disable. Adjustable soft-start capacitance to be attached here.", 5 PGOOD1 (oc) "Power Good window comparator outputs for channel 1 and channel 2. The applied voltage should be less than 6 V, and the recommended pull-up resistance value is from 100 k ohm to 1 Mohm.", 6 SKIPSEL1 (in) "Skip mode selection pin.   GND: Continuous conduction mode VREF2: Auto skip  VREG3: OOA auto skip, maximum 7 skips (suitable for fsw < 400 kHz)  VREG5: OOA auto skip, maximum 15 skips (suitable for equal to or greater than (See Datasheet)", 7 CSP1 (in) "Current sense comparator inputs (+). An RC network with high quality X5R or X7R ceramic capacitor should be used to extract voltage drop across DCR. 0.1 μF is a good value to start the design. See the current sensing scheme (See Datasheet)", 8 CSN1 "Current sense comparator inputs (-). See the current sensing scheme section. Used as power supply for the current sense circuit for 5 V or higher output voltage setting. Also, used for output discharge terminal.", 9 VFB1 (in) "SMPS voltage feedback inputs. Connect the feedback resistors divider, and should be referred to (signal) GND.", 10 COMP1 "Loop compensation pin for current mode (error amplifier output). Connect R (and C if required) from this pin to VREF2 for proper loop compensation with current mode operation. Ramp compensation adjustable pin for D-CAP mode, (See Datasheet)", 11 FUNC (in) "Control architecture and OVP function selection pin. GND: Current mode, OVP enable  VREF2: D-CAP mode, OVP disable  VREG3: D-CAP mode, OVP enable  VREG5: Current mode, OVP disable", 12 EN (in) "VREF2 and VREG5 Linear Regulators Enable Pin. When turning on, apply greater than 1.2V and less than 6V. Connect to GND to Disable.", 13 VREF2 (out) "2-V Reference Output. Bypass to (signal) GND by 0.22μF ceramic capacitor.", 14 TRIP (in) "Control architecture and OVP function selection pin. GND: Current mode, OVP enable  VREF2: V(OCL-ULV), Discharge off  VREG3: V(OCL-LV), Discharge off   VREG5: V(OCL-LV), Discharge on", 15 COMP2 "Loop compensation pin for current mode (error amplifier output). Connect R (and C if required) from this pin to VREF2 for proper loop compensation with current mode operation. Ramp compensation adjustable pin for D-CAP mode, (See Datasheet)", 16 VFB2 (in) "SMPS voltage feedback inputs. Connect the feedback resistors divider, and should be referred to (signal) GND.", 17 CSN2 "Current sense comparator inputs (-). See the current sensing scheme section. Used as power supply for the current sense circuit for 5 V or higher output voltage setting. Also, used for output discharge terminal.", 18 CSP2 (in) "Current sense comparator inputs (+). An RC network with high quality X5R or X7R ceramic capacitor should be used to extract voltage drop across DCR. 0.1 μF is a good value to start the design. See the current sensing scheme (See Datasheet)", 19 SKIPSEL2 (in) "Skip mode selection pin.   GND: Continuous conduction mode VREF2: Auto skip  VREG3: OOA auto skip, maximum 7 skips (suitable for fsw < 400 kHz)  VREG5: OOA auto skip, maximum 15 skips (suitable for equal to or greater than (See Datasheet)", 20 PGOOD2 (oc) "Power Good window comparator outputs for channel 1 and channel 2. The applied voltage should be less than 6 V, and the recommended pull-up resistance value is from 100 k ohm to 1 Mohm.", 21 EN2 (in) "Channel 1 and channel 2 SMPS enable Pins. When turning on, apply greater than 0.55 V and less than 6 V or be floating. Connect to GND to disable. Adjustable soft-start capacitance to be attached here.", 22 VREG3 (power) "Always alive 3.3-V, 10-mA low dropout linear regulator output. Bypass to (signal) GND with more than 1-μF ceramic capacitor. Runs from VIN supply or from VREG5 when it is switched over to V5SW input.", 23 VIN (power) "Supply input for 5-V and 3.3-V linear regulator. Typically connected to VBAT.", 24 DRVH2 (out) "High-side MOSFET gate driver outputs. Source 1.7ohm, sink 1.0ohm, SW-node referenced floating driver. Drive voltage corresponds to VBST to SW voltage", 25 SW2 (power) "High-side MOSFET gate driver returns.", 26 VBST2 (power) "Supply inputs for high-side NFET driver (boot strap Terminal). Connect a capacitor (0.1μF or greater is recommended) from this pin to respective SW terminal. Additional SB diode from VREG5 to this pin is an optional.", 27 DRVL2 (out) "Low-side MOSFET gate driver outputs. Source 1.3 ohm, sink 0.7 ohm, GND referenced driver.", 28 GND (power) "Ground.", 29 VREG5 (power) "5-V, 100-mA low-dropout linear regulator output. Bypass to (power) GND using a 10-μF ceramic capacitor Runs from VIN supply. Internally connected to VBST and DRVL. Shuts off with EN. Switches over to V5SW when 4.8 V or above (See Datasheet)", 30 DRVL1 (out) "Low-side MOSFET gate driver outputs. Source 1.3 ohm, sink 0.7 ohm, GND referenced driver", 31 VBST1 (power) "Supply inputs for high-side NFET driver (boot strap Terminal). Connect a capacitor (0.1μF or greater is recommended) from this pin to respective SW terminal. Additional SB diode from VREG5 to this pin is an optional.", 32 SW1 (power) "High-side MOSFET gate driver returns.", 33 EP (power) "Connect to the ground."